# Altium footprint library standard.PcbLib: 330 footprints (part 17 of 21)
Each footprint in its own frame and in the unit in brackets; x right, y up, seen from the top. Pads: shape width x height; smd on the part's side, far side on the other; paste and mask are expansions set on the pad; w line width, h text height; cw(c..) or ccw(c..) is an arc to the next point about the centre after c.
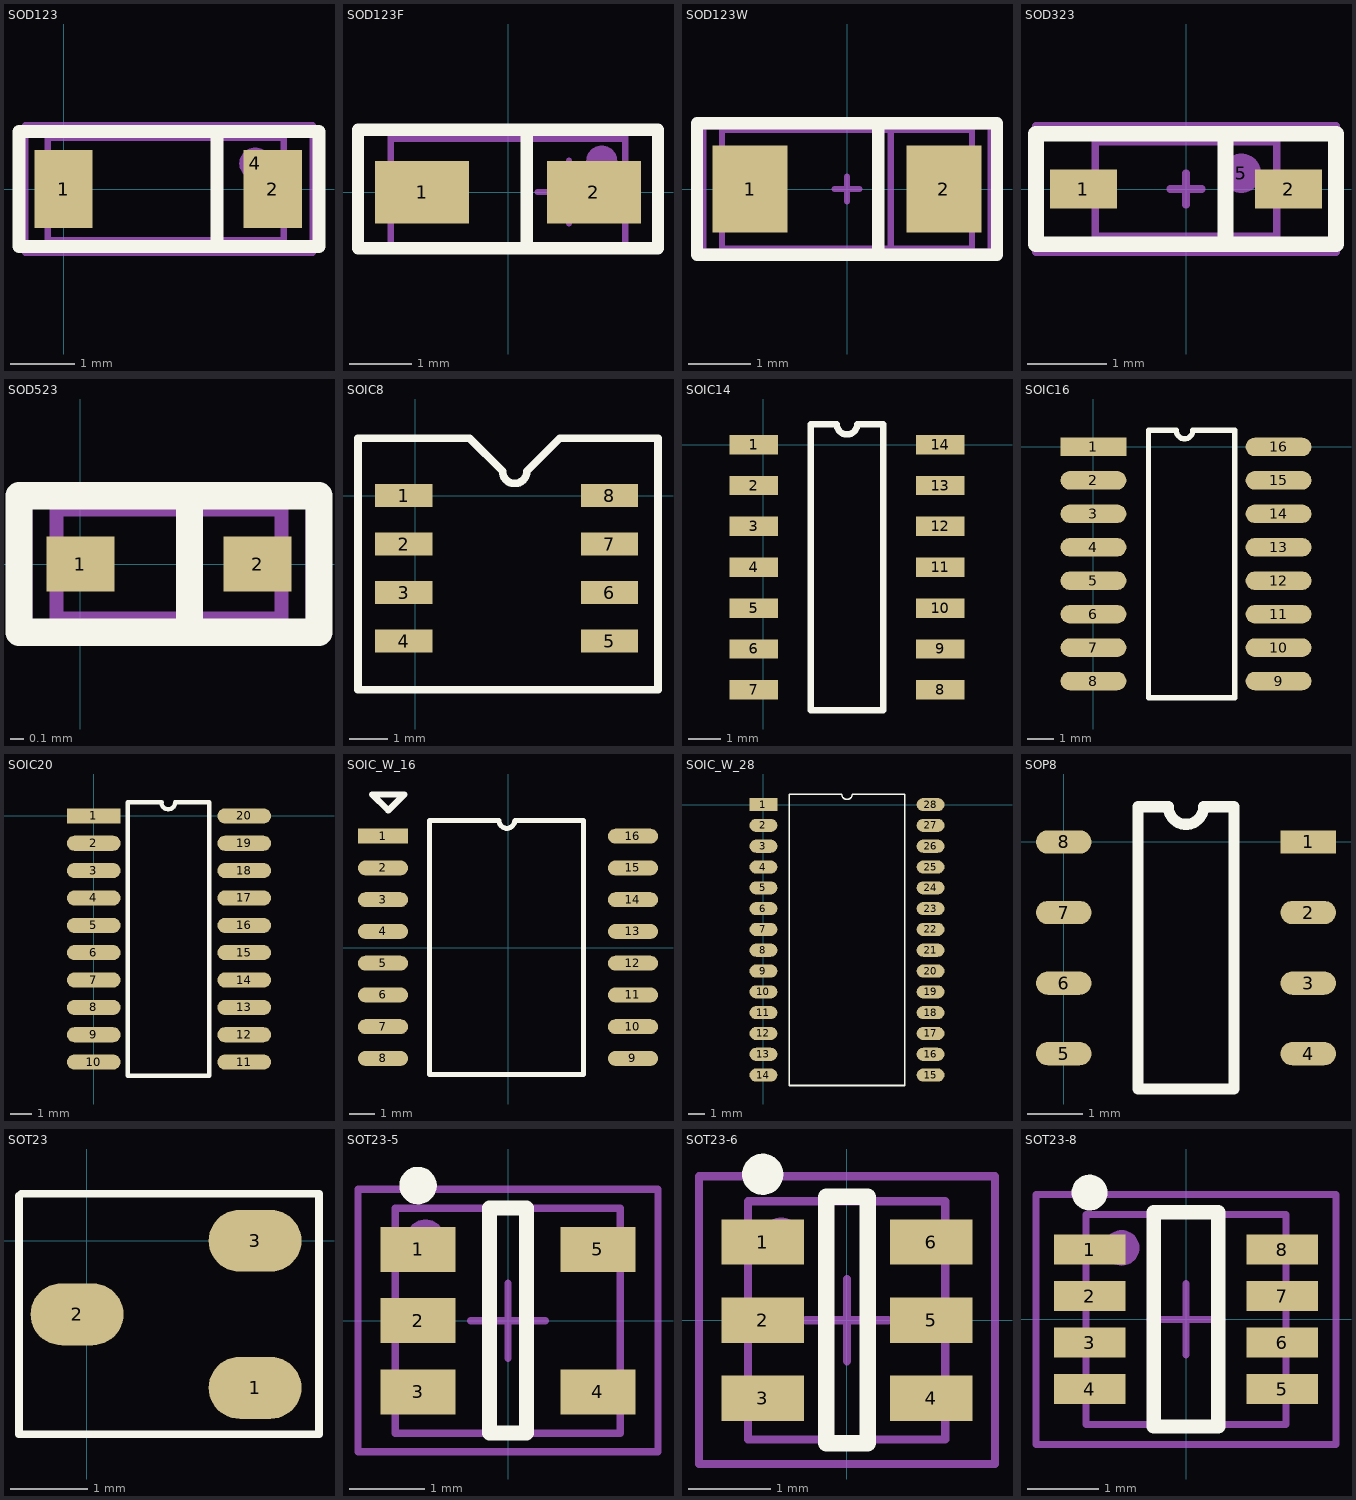
[diagram p16: the footprints below, top view; thin cyan lines are the x and y axes]

## SOD123 [mm]
pads (3):
  rect 0.91x1.22 smd: 1(0,0) 2(3.275,0)
  round 0.5 on Mech1: 4(3,0.4)
Top Overlay:
  lines w0.2: 2.4,-0.9 2.4,0.9 ; -0.7,-0.9 4,-0.9 4,0.9 -0.7,0.9 -0.7,-0.9
Mechanical 1:
  lines w0.1: -0.249,-0.8 3.449,-0.8 3.449,0.8 -0.249,0.8 -0.249,-0.8
Mechanical 15:
  lines w0.1: -0.6,-1 3.9,-1 3.9,1 -0.6,1 -0.6,-1
3D body "User Library-SOD-123.STEP": height 1.25, standoff 0, extent -0.249,-0.8 3.449,0.8

## SOD123F [mm] "Schottky Diode, 2-Leads, Body 3x2mm, 0.4W"
height 1
pads (3):
  rect 1.5x1 smd: 1(-1.375,0) 2(1.375,0)
  round 0.5 on Mech1: ""(1.5,0.5)
Top Overlay:
  lines w0.2: 0.3,-0.9 0.3,1 ; -2.4,-0.9 2.4,-0.9 2.4,1 2.3,1 -2.4,1 -2.4,-0.9
Mechanical 1:
  lines w0.1: -1.875,-0.85 -1.875,0.85 1.875,0.85 1.875,-0.85 -1.875,-0.85
Mechanical 15:
  lines w0.1: 0.475,0 1.475,0 ; 0.975,-0.5 0.975,0.5 ; -1.875,-0.9 -1.875,0.9 1.875,0.9 1.875,-0.9 -1.875,-0.9
3D body "SOD123F.STEP": height 1.23, standoff 0.02, extent -1.875,-0.85 1.875,0.85

## SOD123W [mm]
pads (2):
  rect 1.2x1.4 smd: 1(-1.55,0) 2(1.55,0)
Top Overlay:
  lines w0.2: 0.5,-1.05 0.5,1.05 ; -2.4,-1.05 2.4,-1.05 2.4,1.05 -2.4,1.05 -2.4,-1.05
Mechanical 1:
  lines w0.1: 0.7,-0.95 0.7,0.95 ; 2,-0.95 -2,-0.95 -2,0.95 2,0.95 ; 2,-0.95 2,-0.95 ; 2,-0.95 2,0.95 ; 2,0.95 2,0.95
Mechanical 15:
  lines w0.1: -0.2,0 0.2,0 ; 0,-0.2 0,0.2 ; -2.3,-1 -2.3,1 2.3,1 2.3,-1 -2.3,-1
3D body "User Library-SOD123W.STEP": height 1.1, standoff -0.01, extent -2,-0.95 2,0.95

## SOD323 [mm]
pads (3):
  rect 0.85x0.5 smd: 1(-1.3,0) 2(1.3,0)
  round 0.5 on Mech1: 5(0.7,0.2)
Top Overlay:
  lines w0.2: 0.5,-0.7 0.5,0.7 ; -1.9,-0.7 1.9,-0.7 1.9,0.7 -1.9,0.7 -1.9,-0.7
Mechanical 1:
  lines w0.1: -1.15,-0.6 -1.15,0.6 1.15,0.6 1.15,-0.6 -1.15,-0.6
Mechanical 15:
  lines w0.1: -0.2,0 0.2,0 ; 0,-0.2 0,0.2 ; -1.9,-0.8 1.9,-0.8 1.9,0.8 -1.9,0.8 -1.9,-0.8
3D body "User Library-1N4148WS.STEP": height 1.04, standoff -0.06, extent -1.15,-0.6 1.15,0.6

## SOD523 [mm]
pads (2):
  rect 0.5x0.4 smd: 1(0,0) 2(1.3,0)
Top Overlay:
  lines w0.2: 0.8,-0.4 0.8,0.5 ; -0.45,-0.5 -0.45,0.5 1.75,0.5 1.75,-0.5 -0.45,-0.5
Mechanical 1:
  lines w0.1: 0.8,-0.4 0.8,0.4 ; -0.175,-0.4 1.475,-0.4 1.475,0.4 1.4,0.4 -0.175,0.4 -0.175,-0.4
Mechanical 15:
  lines w0.1: -0.4,-0.5 -0.4,0.5 1.7,0.5 1.7,-0.5 -0.4,-0.5
3D body "User Library-SOD523-2.STEP": height 0.65, standoff 0, extent -0.175,-0.4 1.475,0.4

## SOIC8 [mm]
pads (8):
  rect 1.5x0.6 smd: 1(-0.3,0) 2(-0.3,-1.27) 3(-0.3,-2.54) 4(-0.3,-3.81) 5(5.08,-3.81) 6(5.08,-2.54) 7(5.08,-1.27) 8(5.08,0)
Top Overlay:
  lines w0.2: -1.5,-5.08 -1.5,1.5 1.418,1.5 2.282,0.635 ccw(c2.6,0.635) 2.917,0.635 3.782,1.5 6.35,1.5 6.35,-3.414 6.35,-5.08 5.08,-5.08 -1.5,-5.08
3D body "User Library-SOIC-8-1.step": height 1.75, standoff 0, extent -0.7,-4.35 5.3,0.55

## SOIC14 [mm]
pads (14):
  rect 1.5x0.6 smd: 1(-0.3,0) 2(-0.3,-1.27) 3(-0.3,-2.54) 4(-0.3,-3.81) 5(-0.3,-5.08) 6(-0.3,-6.35) 7(-0.3,-7.62) 8(5.5,-7.62) 9(5.5,-6.35) 10(5.5,-5.08) 11(5.5,-3.81) 12(5.5,-2.54) 13(5.5,-1.27) 14(5.5,0)
Top Overlay:
  lines w0.2: 1.47,-8.255 3.73,-8.255 3.73,0.635 2.917,0.635 cw(c2.6,0.635) 2.282,0.635 1.47,0.635 1.47,-8.255

## SOIC16 [mm]
pads (16):
  rect 2.5x0.7 smd: 1(0,0)
  oval 2.5x0.7 smd: 2(0,-1.27) 3(0,-2.54) 4(0,-3.81) 5(0,-5.08) 6(0,-6.35) 7(0,-7.62) 8(0,-8.89) 9(7.025,-8.89) 10(7.025,-7.62) 11(7.025,-6.35) 12(7.025,-5.08) 13(7.025,-3.81) 14(7.025,-2.54) 15(7.025,-1.27) 16(7.025,0)
Top Overlay:
  lines w0.2: 3.14,0.625 ccw(c3.457,0.625) 3.775,0.625 ; 3.15,0.635 2.085,0.635 2.085,-9.525 5.35,-9.525 ; 3.767,0.635 5.365,0.635 5.365,-9.525
3D body "User Library-SOIC-16.step": height 1.4, standoff 0, extent 0.6,-9.35 6.6,0.55

## SOIC20 [mm]
pads (20):
  rect 2.5x0.7 smd: 1(0,0)
  oval 2.5x0.7 smd: 2(0,-1.27) 3(0,-2.54) 4(0,-3.81) 5(0,-5.08) 6(0,-6.35) 7(0,-7.62) 8(0,-8.89) 9(0,-10.16) 10(0,-11.43) 11(6.985,-11.43) 12(6.985,-10.16) 13(6.985,-8.89) 14(6.985,-7.62) 15(6.985,-6.35) 16(6.985,-5.08) 17(6.985,-3.81) 18(6.985,-2.54) 19(6.985,-1.27) 20(6.985,0)
Top Overlay:
  lines w0.2: 3.14,0.625 ccw(c3.457,0.625) 3.775,0.625 ; 3.15,0.635 1.575,0.635 1.575,-12.065 5.365,-12.065 5.365,0.635 3.767,0.635

## SOIC_W_16 [mm]
pads (16):
  rect 2x0.6 smd: 1(-5,4.456)
  oval 2x0.6 smd: 2(-5,3.186) 3(-5,1.916) 4(-5,0.646) 5(-5,-0.624) 6(-5,-1.894) 7(-5,-3.164) 8(-5,-4.434) 9(5,-4.434) 10(5,-3.164) 11(5,-1.894) 12(5,-0.624) 13(5,0.646) 14(5,1.916) 15(5,3.186) 16(5,4.456)
Top Overlay:
  lines w0.2: -3.136,-5.069 -3.136,5.091 -0.364,5.091 ccw(c-0.046,5.091) 0.271,5.091 3.019,5.091 3.019,-5.069 -3.136,-5.069
  lines w0.254: -4.831,5.531 -4.787,5.487 -4.15,6.125 -5.425,6.125 -4.831,5.531 ; -4.831,5.531 -4.831,5.531
3D body "so16w.step": height 3.5, standoff 0, extent -5.156,-5.144 5.144,5.056

## SOIC_W_28 [mm]
pads (28):
  rect 1.7x0.8 smd: 1(0,0)
  oval 1.7x0.8 smd: 2(0,-1.27) 3(0,-2.54) 4(0,-3.81) 5(0,-5.08) 6(0,-6.35) 7(0,-7.62) 8(0,-8.89) 9(0,-10.16) 10(0,-11.43) 11(0,-12.7) 12(0,-13.97) 13(0,-15.24) 14(0,-16.51) 15(10.2,-16.51) 16(10.2,-15.24) 17(10.2,-13.97) 18(10.2,-12.7) 19(10.2,-11.43) 20(10.2,-10.16) 21(10.2,-8.89) 22(10.2,-7.62) 23(10.2,-6.35) 24(10.2,-5.08) 25(10.2,-3.81) 26(10.2,-2.54) 27(10.2,-1.27) 28(10.2,0)
Top Overlay:
  lines w0.1: 1.585,-17.145 8.615,-17.145 8.615,0.635 5.417,0.635 cw(c5.1,0.635) 4.782,0.635 1.585,0.635 1.585,-17.145

## SOP8 [mm]
pads (8):
  rect 1x0.42 smd: 1(4.4,0)
  oval 1x0.42 smd: 2(4.4,-1.27) 3(4.4,-2.54) 4(4.4,-3.81) 5(0,-3.81) 6(0,-2.54) 7(0,-1.27) 8(0,0)
Top Overlay:
  lines w0.2: 1.335,-4.445 3.065,-4.445 3.065,0.635 2.518,0.635 cw(c2.2,0.635) 1.883,0.635 1.335,0.635 1.335,-4.445

## SOT23 [mm]
pads (3):
  oval 1.2x0.8 smd: 1(2.175,-1.9) 2(-0.125,-0.95) 3(2.175,0)
Top Overlay:
  lines w0.1: -0.875,-2.5 -0.875,-0.649 -0.875,0.58 -0.869,0.58 -0.842,0.608 2.148,0.608 2.825,0.608 3,0.608 3,-2.5 -0.875,-2.5
3D body "User Library-SOT23-3.step": height 1.3, standoff 0, extent -0.3,-2.4 2.5,0.5

## SOT23-5 [mm] "SOT23, 5-Leads, Body 2,90x2,80mm, Pitch 0,95mm, IPC Medium Density"
height 1.45
pads (6):
  rect 1x0.6 smd: 1(-1.2,0.95) 2(-1.2,0) 3(-1.2,-0.95) 4(1.2,-0.95) 5(1.2,0.95)
  round 0.5 on Mech1: ""(-1.1,1.1)
Top Overlay:
  circle w0.25: c-1.2,1.8 r0.125
  lines w0.2: -0.25,-1.5 0.25,-1.5 0.25,1.5 -0.25,1.5 -0.25,-1.5
Mechanical 1:
  lines w0.1: -1.5,-1.5 -1.5,1.5 1.5,1.5 1.5,-1.5 -1.5,-1.5
Mechanical 15:
  lines w0.1: -0.5,0 0.5,0 ; 0,-0.5 0,0.5 ; -2,-1.75 -2,1.75 2,1.75 2,-1.75 -2,-1.75
3D body "SOT23-5-1.step": height 1.3, standoff 0, extent -1.5,-1.5 1.5,1.5

## SOT23-6 [mm] "SOT23, 6-Leads, Body 2,90x2,45mm, Pitch 0,95mm, IPC Medium Density"
height 1.1
pads (7):
  rect 1x0.55 smd: 1(-1.025,0.95) 2(-1.025,0) 3(-1.025,-0.95) 4(1.025,-0.95) 5(1.025,0) 6(1.025,0.95)
  round 0.5 on Mech1: ""(-0.8,1)
Top Overlay:
  circle w0.25: c-1.025,1.775 r0.125
  lines w0.2: -0.25,-1.5 0.25,-1.5 0.25,1.5 -0.25,1.5 -0.25,-1.5
Mechanical 1:
  lines w0.1: -1.204,-1.453 -1.204,1.447 1.196,1.447 1.196,-1.453 -1.204,-1.453
Mechanical 15:
  lines w0.1: -0.5,0 0.5,0 ; 0,-0.5 0,0.5 ; -1.8,-1.75 -1.8,1.75 1.8,1.75 1.8,-1.75 -1.8,-1.75
3D body "User Library-SOT23-6-2.STEP": height 1.45, standoff 0, extent -1.4,-1.45 1.4,1.45

## SOT23-8 [mm] "8-Lead Small Outline Transistor Package [SOT-23]"
height 1.45
pads (9):
  rect 1x0.42 smd: 1(-1.35,0.975) 2(-1.35,0.325) 3(-1.35,-0.325) 4(-1.35,-0.975) 5(1.35,-0.975) 6(1.35,-0.325) 7(1.35,0.325) 8(1.35,0.975)
  round 0.5 on Mech1: ""(-0.9,1)
Top Overlay:
  circle w0.25: c-1.35,1.775 r0.125
  lines w0.2: -0.45,-1.5 -0.45,1.5 0.45,1.5 0.45,-1.5 -0.45,-1.5
Mechanical 1:
  lines w0.1: -1.4,-1.47 -1.4,1.47 1.4,1.47 1.4,-1.47 -1.4,-1.47
Mechanical 15:
  lines w0.1: -0.5,0 0.5,0 ; 0,-0.5 0,0.5 ; -2.1,-1.75 -2.1,1.75 2.1,1.75 2.1,-1.75 -2.1,-1.75
3D body "User Library-sot238.STEP": height 1.2, standoff 0, extent -1.4,-1.47 1.4,1.47